# Altium footprint library ic.PcbLib: 108 footprints (part 6 of 7)
Each footprint in its own frame and in the unit in brackets; x right, y up, seen from the top. Pads: shape width x height; smd on the part's side, far side on the other; paste and mask are expansions set on the pad; w line width, h text height; cw(c..) or ccw(c..) is an arc to the next point about the centre after c.
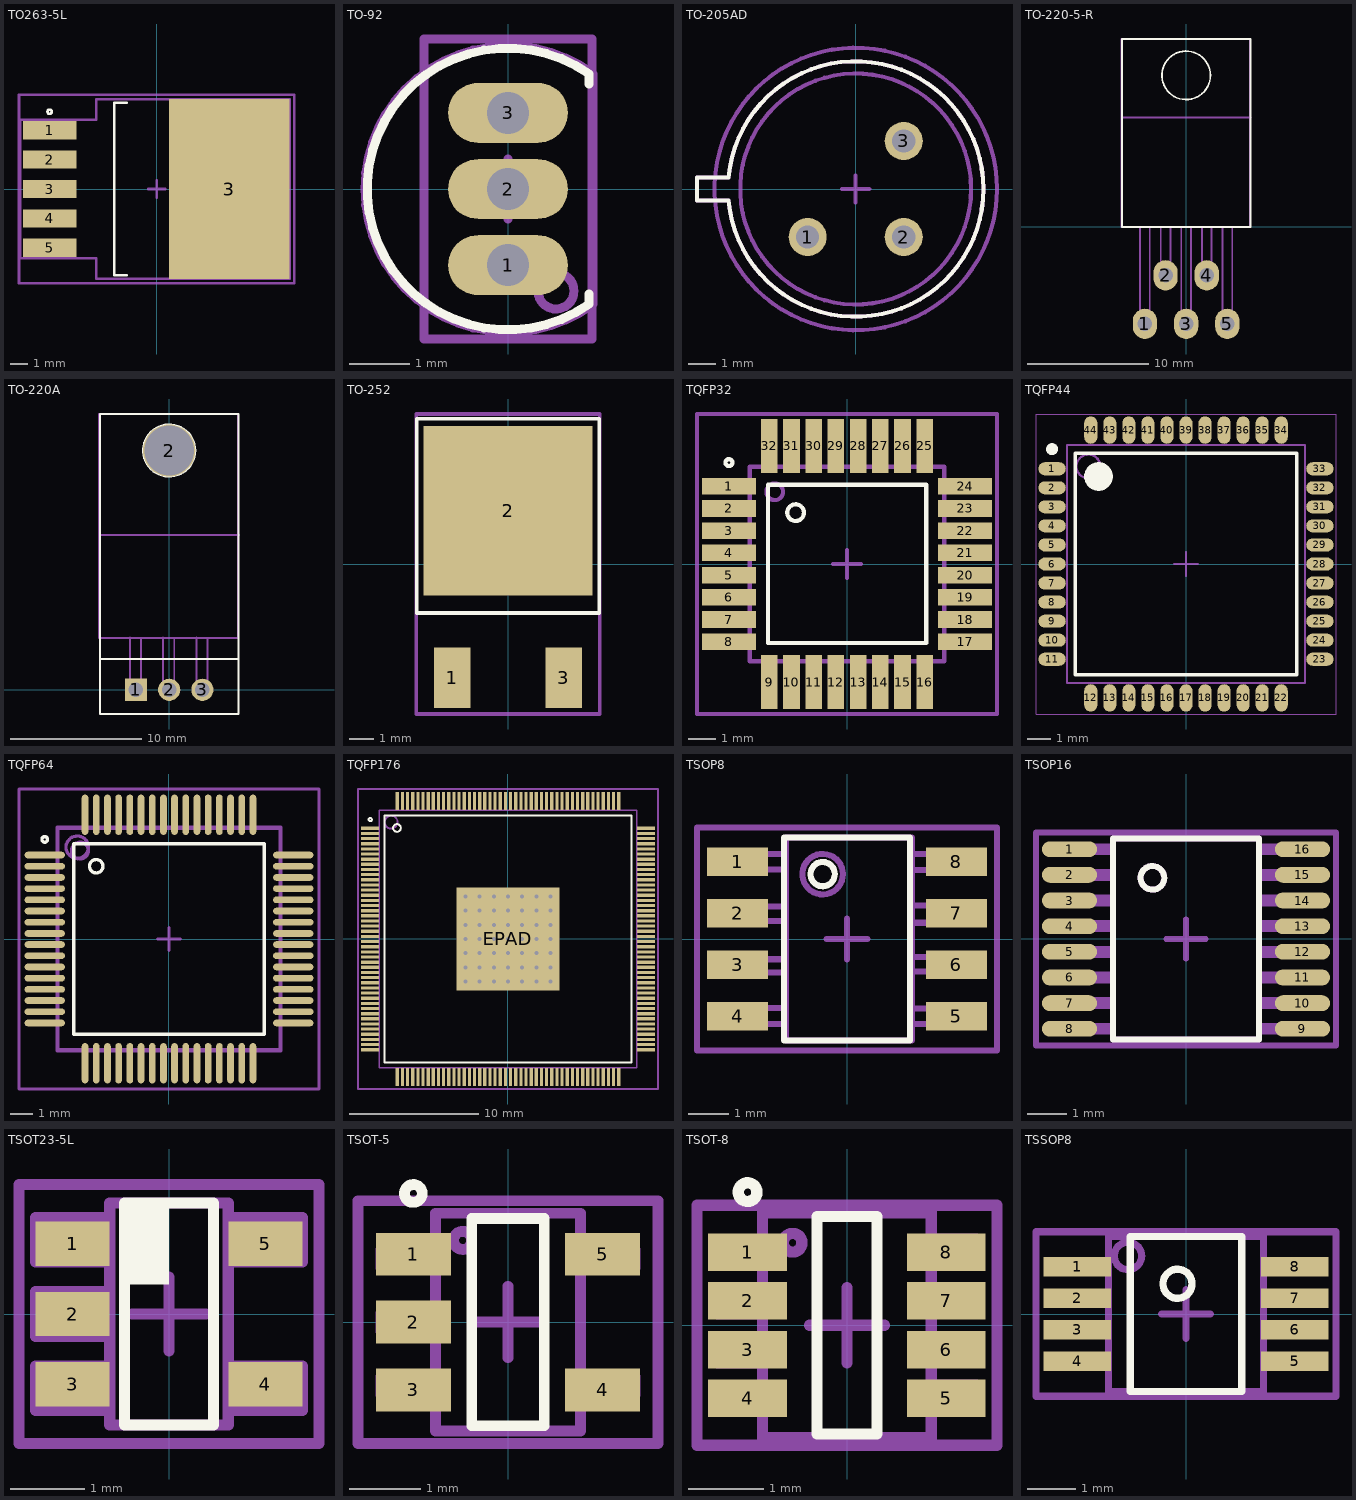
[diagram p5: the footprints below, top view; thin cyan lines are the x and y axes]

## TO263-5L [mm] "D2-PAK, 6-Pads, Body 7,35x8,36mm (max), IPC Medium Density"
height 4.6
pads (6):
  rect 3.1x1.05 smd: 1(-6.2,3.4) 2(-6.2,1.7) 3(-6.2,0) 4(-6.2,-1.7) 5(-6.2,-3.4)
  rect 7x10.4 smd: 3(4.2,0)
Top Overlay:
  circle w0.15: c-6.2,4.475 r0.125
  lines w0.15: -1.75,-5 -2.45,-5 -2.45,5 -1.75,5
Top Courtyard:
  lines w0.15: -0.5,0 0.5,0 ; 0,-0.5 0,0.5 ; -7.975,-5.45 7.975,-5.45 7.975,5.45 -7.975,5.45 -7.975,-5.45 ; -7.9,-4 -3.5,-4 -3.5,-5.2 7.7,-5.2 7.7,0 7.7,5.2 -3.5,5.2 -3.5,4 -7.9,4 -7.9,0 -7.9,-4
3D body "TO263-5L.step": height 4.6, standoff 0, extent -6.665,-5.05 7.685,5.05

## TO-92 [mm] "TO, Flat Index; 3 In-Line, Axial Leads; Body Dia. 4.6mm; Leads 0.41 x 0.39 mm (max)"
height 4.7
pads (3):
  oval 2x1 hole 0.7: 1(0,-1.27) 2(0,0) 3(0,1.27)
Top Overlay:
  lines w0.15: 1.35,-1.75 1.35,-1.92 cw(c0,0) 1.35,1.92 1.35,1.75
  text "." at 1.6,-1.3 h0.1
Top Courtyard:
  lines w0.15: -0.5,0 0.5,0 ; 0,-0.5 0,0.5 ; -1.4,-2.5 -1.4,0 -1.4,2.5 0,2.5 1.4,2.5 1.4,0 1.4,-2.5 0,-2.5 -1.4,-2.5
Mechanical 29:
  circle w0.15: c0.8,-1.7 r0.3
  lines w0.15: 1.415,-1.92 cw(c0,0) 1.415,1.92 1.415,-1.92
  text ".Designator" at -2.2,-0.3 h1
3D body "TO-92.STEP": height 7, standoff -3, extent -2.5,-2.499 1.501,2.499

## TO-205AD [mm]
height 10.1
pads (3):
  round 1.4 hole 0.85: 1(-1.768,-1.768) 2(1.768,-1.768) 3(1.768,1.768)
Top Overlay:
  lines w0.15: -5.84,-0.43 -5.84,0.43 -4.68,0.43 cw(c0,0) -4.68,-0.431 -5.84,-0.43
Top Courtyard:
  lines w0.15: -0.5,0 0.5,0 ; 0,-0.5 0,0.5
M15:
  circle w0.15: c0,0 r5.2
Mechanical 29:
  circle w0.15: c0,0 r4.25
  lines w0.15: -5.84,-0.43 -5.84,0.43 -4.68,0.43 cw(c0,0) -4.68,-0.431 -5.84,-0.43
  text ".Designator" at -3.3,-0.3 h1
3D body "TO-39.STEP": height 10.1, standoff -8.32, extent -6.645,-6.645 6.647,6.647

## TO-220-5-R [mm]
height 5
pads (5):
  oval 2x2.5 hole 1.2: 1(-3.4,-8) 2(-1.7,-4) 3(0,-8) 4(1.7,-4) 5(3.4,-8)
Top Overlay:
  circle w0.15: c0,12.5 r2
  lines w0.15: -5.3,0 5.3,0 5.3,15.5 -5.3,15.5 -5.3,0
Mechanical 29:
  lines w0.15: -5.35,9.025 5.325,9.025 ; -3.8,0 -3.8,-8 -3,-8 -3,0 ; -2.1,0 -2.1,-4 -1.3,-4 -1.3,0 ; -0.4,0 -0.4,-8 0.4,-8 0.4,0 ; 1.3,0 1.3,-4 2.1,-4 2.1,0 ; 3,0 3,-8 3.8,-8 3.8,0 ; -5.35,0 -5.35,15.5 5.275,15.5 5.275,0 -5.35,0
  text ".Designator" at -3.3,2.4 h1

## TO-220A [mm] "TO, Thru-Hole, Vertical, Heatsink Mounted; 3 In-Line Leads; Pitch 2.54 mm"
height 19.7
pads (4):
  rect 1.7x1.7 hole 1.1: 1(-2.54,0)
  round 4 hole 3.8: 2(0,18.288)
  round 1.7 hole 1.1: 2(0,0) 3(2.54,0)
Top Overlay:
  circle w0.15: c0,18.288 r2
  lines w0.15: -5.3,2.35 5.3,2.35 ; -5.3,-1.85 -5.3,21.082 5.3,21.082 5.3,-1.85 -5.3,-1.85
Mechanical 29:
  lines w0.15: -5.35,11.825 5.325,11.825 ; -3,4 -3,-0.4 -2.15,-0.4 -2.15,3.95 -2.9,3.95 ; -0.46,4 -0.46,-0.4 0.39,-0.4 0.39,3.95 -0.36,3.95 ; 2.08,4 2.08,-0.4 2.93,-0.4 2.93,3.95 2.18,3.95 ; -5.35,3.95 5.275,3.95 5.275,21.075 -5.35,21.075 -5.35,3.95
  text ".Designator" at -2.7,6 h1
3D body "TO220.STEP": height 4.5, standoff -3.5, extent -5.2,-0.254 5.2,20.846

## TO-252 [mm]
pads (3):
  rect 1.5x2.5 smd: 1(-2.3,-4.7) 3(2.3,-4.7)
  rect 7x7 smd: 2(0,2.2)
Top Overlay:
  lines w0.15: -3.775,-2.025 -3.775,6 3.775,6 3.775,-2.025 0,-2.025 -3.775,-2.025
  text "." at -3.6,-5 h0.1
Top Courtyard:
  lines w0.15: -0.5,0 0.5,0 ; 0,-0.5 0,0.5 ; -3.8,-6.2 -3.8,6.2 3.8,6.2 3.8,-6.2 -3.8,-6.2
3D body "D-PAK.STEP": height 2.3, standoff 0, extent -3.222,-4.925 3.272,4.575

## TQFP32 [mm] "Thin QFP, 32-Leads, Body 7x7mm, Pitch 0.8mm, IPC Low Density"
height 1.2
pads (32):
  rect 1.95x0.6 smd: 1(-4.25,2.8) 2(-4.25,2) 3(-4.25,1.2) 4(-4.25,0.4) 5(-4.25,-0.4) 6(-4.25,-1.2) 7(-4.25,-2) 8(-4.25,-2.8) 17(4.25,-2.8) 18(4.25,-2) 19(4.25,-1.2) 20(4.25,-0.4) 21(4.25,0.4) 22(4.25,1.2) 23(4.25,2) 24(4.25,2.8)
  rect 0.6x1.95 smd: 9(-2.8,-4.25) 10(-2,-4.25) 11(-1.2,-4.25) 12(-0.4,-4.25) 13(0.4,-4.25) 14(1.2,-4.25) 15(2,-4.25) 16(2.8,-4.25) 25(2.8,4.25) 26(2,4.25) 27(1.2,4.25) 28(0.4,4.25) 29(-0.4,4.25) 30(-1.2,4.25) 31(-2,4.25) 32(-2.8,4.25)
Top Overlay:
  circle w0.15: c-4.25,3.65 r0.125
  circle w0.15: c-1.85,1.85 r0.3
  lines w0.15: -2.85,-2.85 -2.85,2.85 2.85,2.85 2.85,-2.85 -2.85,-2.85
Top Courtyard:
  lines w0.15: -0.5,0 0.5,0 ; 0,-0.5 0,0.5 ; -5.4,-5.4 -5.4,5.4 5.4,5.4 5.4,-5.4 -5.4,-5.4
Mechanical 29:
  circle w0.15: c-2.6,2.6 r0.3
  lines w0.15: -3.5,-3 -5.15,-3 -5.15,-2.65 -3.5,-2.65 ; -3.5,-2.175 -5.15,-2.175 -5.15,-1.825 -3.5,-1.825 ; -3.5,-1.375 -5.15,-1.375 -5.15,-1.025 -3.5,-1.025 ; -3.5,-0.575 -5.15,-0.575 -5.15,-0.225 -3.5,-0.225 ; -3.5,0.225 -5.15,0.225 -5.15,0.575 -3.5,0.575 ; -3.5,1.05 -5.15,1.05 -5.15,1.4 -3.5,1.4 ; -3.5,1.85 -5.15,1.85 -5.15,2.2 -3.5,2.2 ; -3.5,2.65 -5.15,2.65 -5.15,3 -3.5,3 ; -3,-3.5 -3,-5.15 -2.65,-5.15 -2.65,-3.5 ; -3,3.5 -3,5.15 -2.65,5.15 -2.65,3.5 ; -2.2,-3.5 -2.2,-5.15 -1.85,-5.15 -1.85,-3.5 ; -2.175,3.5 -2.175,5.15 -1.825,5.15 -1.825,3.5 ; -1.4,-3.5 -1.4,-5.15 -1.05,-5.15 -1.05,-3.5 ; -1.375,3.5 -1.375,5.15 -1.025,5.15 -1.025,3.5 ; -0.575,-3.5 -0.575,-5.15 -0.225,-5.15 -0.225,-3.5 ; -0.575,3.5 -0.575,5.15 -0.225,5.15 -0.225,3.5 ; 0.225,-3.5 0.225,-5.15 0.575,-5.15 0.575,-3.5 ; 0.225,3.5 0.225,5.15 0.575,5.15 0.575,3.5 ; 1.025,-3.5 1.025,-5.15 1.375,-5.15 1.375,-3.5 ; 1.05,3.5 1.05,5.15 1.4,5.15 1.4,3.5 ; 1.825,-3.5 1.825,-5.15 2.175,-5.15 2.175,-3.5 ; 1.85,3.5 1.85,5.15 2.2,5.15 2.2,3.5 ; 2.65,-3.5 2.65,-5.15 3,-5.15 3,-3.5 ; 2.65,3.5 2.65,5.15 3,5.15 3,3.5 ; 3.5,-3 5.15,-3 5.15,-2.65 3.5,-2.65 ; 3.5,-2.2 5.15,-2.2 5.15,-1.85 3.5,-1.85 ; 3.5,-1.4 5.15,-1.4 5.15,-1.05 3.5,-1.05 ; 3.5,-0.575 5.15,-0.575 5.15,-0.225 3.5,-0.225 ; 3.5,0.225 5.15,0.225 5.15,0.575 3.5,0.575 ; 3.5,1.025 5.15,1.025 5.15,1.375 3.5,1.375 ; 3.5,1.825 5.15,1.825 5.15,2.175 3.5,2.175 ; 3.5,2.65 5.15,2.65 5.15,3 3.5,3 ; -3.5,-3.5 -3.5,3.5 3.5,3.5 3.5,-3.5 -3.5,-3.5
  text ".Designator" at -2.8,-0.3 h1

## TQFP44 [mm] "TQFP, 44-Leads, Body 10,00x10,00mm, Pitch 0,80mm, IPC High Density"
height 1.2
pads (44):
  oval 1.15x0.55 smd: 1(-5.625,4) 2(-5.625,3.2) 3(-5.625,2.4) 4(-5.625,1.6) 5(-5.625,0.8) 6(-5.625,0) 7(-5.625,-0.8) 8(-5.625,-1.6) 9(-5.625,-2.4) 10(-5.625,-3.2) 11(-5.625,-4) 23(5.625,-4) 24(5.625,-3.2) 25(5.625,-2.4) 26(5.625,-1.6) 27(5.625,-0.8) 28(5.625,0) 29(5.625,0.8) 30(5.625,1.6) 31(5.625,2.4) 32(5.625,3.2) 33(5.625,4)
  oval 0.55x1.15 smd: 12(-4,-5.625) 13(-3.2,-5.625) 14(-2.4,-5.625) 15(-1.6,-5.625) 16(-0.8,-5.625) 17(0,-5.625) 18(0.8,-5.625) 19(1.6,-5.625) 20(2.4,-5.625) 21(3.2,-5.625) 22(4,-5.625) 34(4,5.625) 35(3.2,5.625) 36(2.4,5.625) 37(1.6,5.625) 38(0.8,5.625) 39(0,5.625) 40(-0.8,5.625) 41(-1.6,5.625) 42(-2.4,5.625) 43(-3.2,5.625) 44(-4,5.625)
Top Overlay:
  circle w0.25: c-5.625,4.825 r0.125
  circle w0.6: c-3.675,3.675 r0.3
  lines w0.15: -4.65,-4.65 -4.65,4.65 4.65,4.65 4.65,-4.65 -4.65,-4.65
Top Courtyard:
  lines w0.05: -6.3,-6.3 -6.3,6.3 6.3,6.3 6.3,-6.3 -6.3,-6.3
  lines w0.1: -0.5,0 0.5,0 ; 0,-0.5 0,0.5
Mechanical 13:
  circle w0.1: c-4.1,4.1 r0.5
  lines w0.1: -5,-5 -5,5 5,5 5,-5 -5,-5
3D body "TQFP44.step": height 1.2, standoff 0, extent -6,-6 6,6

## TQFP64 [mm]
pads (64):
  oval 1.8x0.3 smd: 1(-5.55,3.75) 2(-5.55,3.25) 3(-5.55,2.75) 4(-5.55,2.25) 5(-5.55,1.75) 6(-5.55,1.25) 7(-5.55,0.75) 8(-5.55,0.25) 9(-5.55,-0.25) 10(-5.55,-0.75) 11(-5.55,-1.25) 12(-5.55,-1.75) 13(-5.55,-2.25) 14(-5.55,-2.75) 15(-5.55,-3.25) 16(-5.55,-3.75) 33(5.55,-3.75) 34(5.55,-3.25) 35(5.55,-2.75) 36(5.55,-2.25) 37(5.55,-1.75) 38(5.55,-1.25) 39(5.55,-0.75) 40(5.55,-0.25) 41(5.55,0.25) 42(5.55,0.75) 43(5.55,1.25) 44(5.55,1.75) 45(5.55,2.25) 46(5.55,2.75) 47(5.55,3.25) 48(5.55,3.75)
  oval 0.3x1.8 smd: 17(-3.75,-5.55) 18(-3.25,-5.55) 19(-2.75,-5.55) 20(-2.25,-5.55) 21(-1.75,-5.55) 22(-1.25,-5.55) 23(-0.75,-5.55) 24(-0.25,-5.55) 25(0.25,-5.55) 26(0.75,-5.55) 27(1.25,-5.55) 28(1.75,-5.55) 29(2.25,-5.55) 30(2.75,-5.55) 31(3.25,-5.55) 32(3.75,-5.55) 49(3.75,5.55) 50(3.25,5.55) 51(2.75,5.55) 52(2.25,5.55) 53(1.75,5.55) 54(1.25,5.55) 55(0.75,5.55) 56(0.25,5.55) 57(-0.25,5.55) 58(-0.75,5.55) 59(-1.25,5.55) 60(-1.75,5.55) 61(-2.25,5.55) 62(-2.75,5.55) 63(-3.25,5.55) 64(-3.75,5.55)
Top Overlay:
  circle w0.15: c-3.25,3.25 r0.3
  circle w0.15: c-5.55,4.45 r0.125
  lines w0.15: -4.25,-4.25 4.25,-4.25 4.25,4.25 -4.25,4.25 -4.25,-4.25
Top Courtyard:
  lines w0.15: -0.5,0 0.5,0 ; 0,-0.5 0,0.5 ; -6.7,-6.7 6.7,-6.7 6.7,6.7 -6.7,6.7 -6.7,-6.7
Mechanical 13:
  circle w0.15: c-4.1,4.1 r0.5
Mechanical 29:
  circle w0.15: c-3.975,3.95 r0.375
  lines w0.15: -6.35,-3.8 -4.975,-3.8 ; -6.35,-3.275 -4.975,-3.275 ; -6.35,-2.775 -4.975,-2.775 ; -6.35,-2.275 -4.975,-2.275 ; -6.35,-1.8 -4.975,-1.8 ; -6.35,-1.275 -4.975,-1.275 ; -6.35,-0.775 -4.975,-0.775 ; -6.35,-0.275 -4.975,-0.275 ; -6.35,0.2 -4.975,0.2 ; -6.35,0.725 -4.975,0.725 ; -6.35,1.225 -4.975,1.225 ; -6.35,1.725 -4.975,1.725 ; -6.35,2.2 -4.975,2.2 ; -6.35,2.725 -4.975,2.725 ; -6.35,3.225 -4.975,3.225 ; -6.35,3.725 -4.975,3.725 -4.975,3.9 ; -3.925,-4.95 -3.75,-4.95 -3.75,-6.325 ; -3.925,4.95 -3.75,4.95 -3.75,6.325 ; -3.25,-6.325 -3.25,-4.95 ; -3.25,4.95 -3.25,6.325 ; -2.75,-6.325 -2.75,-4.95 ; -2.75,4.95 -2.75,6.325 ; -2.225,-6.325 -2.225,-4.95 ; -2.225,4.95 -2.225,6.325 ; -1.75,-6.325 -1.75,-4.95 ; -1.75,4.95 -1.75,6.325 ; -1.25,-6.325 -1.25,-4.95 ; -1.25,4.95 -1.25,6.325 ; -0.75,-6.325 -0.75,-4.95 ; -0.75,4.95 -0.75,6.325 ; -0.225,-6.325 -0.225,-4.95 ; -0.225,4.95 -0.225,6.325 ; 0.25,-6.325 0.25,-4.95 ; 0.25,4.95 0.25,6.325 ; 0.75,-6.325 0.75,-4.95 ; 0.75,4.95 0.75,6.325 ; 1.25,-6.325 1.25,-4.95 ; 1.25,4.95 1.25,6.325 ; 1.775,-6.325 1.775,-4.95 ; 1.775,4.95 1.775,6.325 ; 2.25,-6.325 2.25,-4.95 ; 2.25,4.95 2.25,6.325 ; 2.75,-6.325 2.75,-4.95 ; 2.75,4.95 2.75,6.325 ; 3.25,-6.325 3.25,-4.95 ; 3.25,4.95 3.25,6.325 ; 3.775,-6.325 3.775,-4.95 ; 3.775,4.95 3.775,6.325 ; 4.975,-3.8 6.35,-3.8 ; 4.975,-3.275 6.35,-3.275 ; 4.975,-2.775 6.35,-2.775 ; 4.975,-2.275 6.35,-2.275 ; 4.975,-1.8 6.35,-1.8 ; 4.975,-1.275 6.35,-1.275 ; 4.975,-0.775 6.35,-0.775 ; 4.975,-0.275 6.35,-0.275 ; 4.975,0.2 6.35,0.2 ; 4.975,0.725 6.35,0.725 ; 4.975,1.225 6.35,1.225 ; 4.975,1.725 6.35,1.725 ; 4.975,2.2 6.35,2.2 ; 4.975,2.725 6.35,2.725 ; 4.975,3.225 6.35,3.225 ; 4.975,3.9 4.975,3.725 6.35,3.725 ; -5,-5 5,-5 5,5 -5,5 -5,-5 ; -4.975,-4.95 4.975,-4.95 4.975,4.95 -4.975,4.95 -4.975,-4.95
  text ".Designator" at -3.4,-0.3 h1
3D body "tqfp64.stp": height 1.1, standoff 0, extent -6,-6 6,6

## TQFP176 [mm] "TQFP, 176-Leads, Body 20,00x20,00mm, Pitch 0,40mm, Thermal Pad 8,00x8,00mm, IPC Medium Density"
height 1.2
pads (177):
  rect 1.4x0.25 smd: 1(-10.7,8.6) 2(-10.7,8.2) 3(-10.7,7.8) 4(-10.7,7.4) 5(-10.7,7) 6(-10.7,6.6) 7(-10.7,6.2) 8(-10.7,5.8) 9(-10.7,5.4) 10(-10.7,5) 11(-10.7,4.6) 12(-10.7,4.2) 13(-10.7,3.8) 14(-10.7,3.4) 15(-10.7,3) 16(-10.7,2.6) 17(-10.7,2.2) 18(-10.7,1.8) 19(-10.7,1.4) 20(-10.7,1) 21(-10.7,0.6) 22(-10.7,0.2) 23(-10.7,-0.2) 24(-10.7,-0.6) 25(-10.7,-1) 26(-10.7,-1.4) 27(-10.7,-1.8) 28(-10.7,-2.2) 29(-10.7,-2.6) 30(-10.7,-3) 31(-10.7,-3.4) 32(-10.7,-3.8) 33(-10.7,-4.2) 34(-10.7,-4.6) 35(-10.7,-5) 36(-10.7,-5.4) 37(-10.7,-5.8) 38(-10.7,-6.2) 39(-10.7,-6.6) 40(-10.7,-7) 41(-10.7,-7.4) 42(-10.7,-7.8) 43(-10.7,-8.2) 44(-10.7,-8.6) 89(10.7,-8.6) 90(10.7,-8.2) 91(10.7,-7.8) 92(10.7,-7.4) 93(10.7,-7) 94(10.7,-6.6) 95(10.7,-6.2) 96(10.7,-5.8) 97(10.7,-5.4) 98(10.7,-5) 99(10.7,-4.6) 100(10.7,-4.2) 101(10.7,-3.8) 102(10.7,-3.4) 103(10.7,-3) 104(10.7,-2.6) 105(10.7,-2.2) 106(10.7,-1.8) 107(10.7,-1.4) 108(10.7,-1) 109(10.7,-0.6) 110(10.7,-0.2) 111(10.7,0.2) 112(10.7,0.6) 113(10.7,1) 114(10.7,1.4) 115(10.7,1.8) 116(10.7,2.2) 117(10.7,2.6) 118(10.7,3) 119(10.7,3.4) 120(10.7,3.8) 121(10.7,4.2) 122(10.7,4.6) 123(10.7,5) 124(10.7,5.4) 125(10.7,5.8) 126(10.7,6.2) 127(10.7,6.6) 128(10.7,7) 129(10.7,7.4) 130(10.7,7.8) 131(10.7,8.2) 132(10.7,8.6)
  rect 0.25x1.4 smd: 45(-8.6,-10.7) 46(-8.2,-10.7) 47(-7.8,-10.7) 48(-7.4,-10.7) 49(-7,-10.7) 50(-6.6,-10.7) 51(-6.2,-10.7) 52(-5.8,-10.7) 53(-5.4,-10.7) 54(-5,-10.7) 55(-4.6,-10.7) 56(-4.2,-10.7) 57(-3.8,-10.7) 58(-3.4,-10.7) 59(-3,-10.7) 60(-2.6,-10.7) 61(-2.2,-10.7) 62(-1.8,-10.7) 63(-1.4,-10.7) 64(-1,-10.7) 65(-0.6,-10.7) 66(-0.2,-10.7) 67(0.2,-10.7) 68(0.6,-10.7) 69(1,-10.7) 70(1.4,-10.7) 71(1.8,-10.7) 72(2.2,-10.7) 73(2.6,-10.7) 74(3,-10.7) 75(3.4,-10.7) 76(3.8,-10.7) 77(4.2,-10.7) 78(4.6,-10.7) 79(5,-10.7) 80(5.4,-10.7) 81(5.8,-10.7) 82(6.2,-10.7) 83(6.6,-10.7) 84(7,-10.7) 85(7.4,-10.7) 86(7.8,-10.7) 87(8.2,-10.7) 88(8.6,-10.7) 133(8.6,10.7) 134(8.2,10.7) 135(7.8,10.7) 136(7.4,10.7) 137(7,10.7) 138(6.6,10.7) 139(6.2,10.7) 140(5.8,10.7) 141(5.4,10.7) 142(5,10.7) 143(4.6,10.7) 144(4.2,10.7) 145(3.8,10.7) 146(3.4,10.7) 147(3,10.7) 148(2.6,10.7) 149(2.2,10.7) 150(1.8,10.7) 151(1.4,10.7) 152(1,10.7) 153(0.6,10.7) 154(0.2,10.7) 155(-0.2,10.7) 156(-0.6,10.7) 157(-1,10.7) 158(-1.4,10.7) 159(-1.8,10.7) 160(-2.2,10.7) 161(-2.6,10.7) 162(-3,10.7) 163(-3.4,10.7) 164(-3.8,10.7) 165(-4.2,10.7) 166(-4.6,10.7) 167(-5,10.7) 168(-5.4,10.7) 169(-5.8,10.7) 170(-6.2,10.7) 171(-6.6,10.7) 172(-7,10.7) 173(-7.4,10.7) 174(-7.8,10.7) 175(-8.2,10.7) 176(-8.6,10.7)
  rect 8x8 smd: EPAD(0,0)
via 3.3,-3.3 diameter 0.7 hole 0.3
via 2.2,-3.3 diameter 0.7 hole 0.3
via 1.1,-3.3 diameter 0.7 hole 0.3
via 0,-3.3 diameter 0.7 hole 0.3
via -1.1,-3.3 diameter 0.7 hole 0.3
via -2.2,-3.3 diameter 0.7 hole 0.3
via -3.3,-3.3 diameter 0.7 hole 0.3
via 3.3,-2.2 diameter 0.7 hole 0.3
via 2.2,-2.2 diameter 0.7 hole 0.3
via 1.1,-2.2 diameter 0.7 hole 0.3
via 0,-2.2 diameter 0.7 hole 0.3
via -1.1,-2.2 diameter 0.7 hole 0.3
via -2.2,-2.2 diameter 0.7 hole 0.3
via -3.3,-2.2 diameter 0.7 hole 0.3
via 3.3,-1.1 diameter 0.7 hole 0.3
via 2.2,-1.1 diameter 0.7 hole 0.3
via 1.1,-1.1 diameter 0.7 hole 0.3
via 0,-1.1 diameter 0.7 hole 0.3
via -1.1,-1.1 diameter 0.7 hole 0.3
via -2.2,-1.1 diameter 0.7 hole 0.3
via -3.3,-1.1 diameter 0.7 hole 0.3
via 3.3,0 diameter 0.7 hole 0.3
via 2.2,0 diameter 0.7 hole 0.3
via 1.1,0 diameter 0.7 hole 0.3
via 0,0 diameter 0.7 hole 0.3
via -1.1,0 diameter 0.7 hole 0.3
via -2.2,0 diameter 0.7 hole 0.3
via -3.3,0 diameter 0.7 hole 0.3
via 3.3,1.1 diameter 0.7 hole 0.3
via 2.2,1.1 diameter 0.7 hole 0.3
via 1.1,1.1 diameter 0.7 hole 0.3
via 0,1.1 diameter 0.7 hole 0.3
via -1.1,1.1 diameter 0.7 hole 0.3
via -2.2,1.1 diameter 0.7 hole 0.3
via -3.3,1.1 diameter 0.7 hole 0.3
via 3.3,2.2 diameter 0.7 hole 0.3
via 2.2,2.2 diameter 0.7 hole 0.3
via 1.1,2.2 diameter 0.7 hole 0.3
via 0,2.2 diameter 0.7 hole 0.3
via -1.1,2.2 diameter 0.7 hole 0.3
via -2.2,2.2 diameter 0.7 hole 0.3
via -3.3,2.2 diameter 0.7 hole 0.3
via 3.3,3.3 diameter 0.7 hole 0.3
via 2.2,3.3 diameter 0.7 hole 0.3
via 1.1,3.3 diameter 0.7 hole 0.3
via 0,3.3 diameter 0.7 hole 0.3
via -1.1,3.3 diameter 0.7 hole 0.3
via -2.2,3.3 diameter 0.7 hole 0.3
via -3.3,3.3 diameter 0.7 hole 0.3
Top Overlay:
  circle w0.15: c-8.625,8.625 r0.3
  circle w0.15: c-10.7,9.275 r0.125
  lines w0.15: -9.6,-9.6 9.6,-9.6 9.6,9.6 -9.6,9.6 -9.6,-9.6
Top Courtyard:
  lines w0.15: -0.5,0 0.5,0 ; 0,-0.5 0,0.5 ; -11.65,-11.65 11.65,-11.65 11.65,11.65 -11.65,11.65 -11.65,-11.65
Mechanical 29:
  circle w0.15: c-9.075,9.075 r0.5
  lines w0.15: -10,-10 10,-10 10,10 -10,10 -10,-10
  text ".Designator" at -3.9,-0.9 h1

## TSOP8 [mm] "8-Lead Plastic Small Outline, Body 4,90x3,85mm, Pitch 1,27mm, IPC Medium Density"
height 1.36
pads (8):
  rect 1.5x0.7 smd: 1(-2.7,1.905) 2(-2.7,0.635) 3(-2.7,-0.635) 4(-2.7,-1.905) 5(2.7,-1.905) 6(2.7,-0.635) 7(2.7,0.635) 8(2.7,1.905)
Top Overlay:
  circle w0.15: c-0.6,1.6 r0.3
  lines w0.15: -1.55,-2.5 1.55,-2.5 1.55,2.5 -1.55,2.5 -1.55,-2.5
  text "." at -2.7,2.8 h0.1
Top Courtyard:
  lines w0.15: -0.5,0 0.5,0 ; 0,-0.5 0,0.5 ; -3.7,-2.75 3.7,-2.75 3.7,2.75 -3.7,2.75 -3.7,-2.75
Mechanical 29:
  circle w0.15: c-0.6,1.6 r0.5
  lines w0.15: -3.3,-2.1 -3.3,-1.7 -1.5,-1.7 -1.5,-2.1 -3.3,-2.1 ; -3.3,-0.83 -3.3,-0.5 -1.5,-0.5 -1.5,-0.83 -3.3,-0.83 ; -3.3,0.44 -3.3,0.8 -1.5,0.8 -1.5,0.44 -3.3,0.44 ; -3.3,1.71 -1.5,1.71 -1.5,2.1 -3.3,2.1 -3.3,1.71 ; -1.5,-2.5 -1.5,2.5 1.6,2.5 1.6,-2.5 -1.5,-2.5 ; 1.6,-2.1 3.3,-2.1 3.3,-1.71 1.6,-1.71 1.6,-2.1 ; 1.6,-0.8 3.3,-0.8 3.3,-0.44 1.6,-0.44 1.6,-0.8 ; 1.6,0.4 3.3,0.4 3.3,0.83 1.6,0.83 1.6,0.4 ; 1.6,1.7 3.3,1.7 3.3,2.1 1.6,2.1 1.6,1.7
  text ".Designator" at -1.3,-0.4 h1

## TSOP16 [mm] "TSOP, 16-Leads, Body 5,00x4,40mm, Pitch 0,65mm, IPC Medium Density"
height 1.2
pads (16):
  oval 1.4x0.4 smd: 1(-2.95,2.275) 2(-2.95,1.625) 3(-2.95,0.975) 4(-2.95,0.325) 5(-2.95,-0.325) 6(-2.95,-0.975) 7(-2.95,-1.625) 8(-2.95,-2.275) 9(2.95,-2.275) 10(2.95,-1.625) 11(2.95,-0.975) 12(2.95,-0.325) 13(2.95,0.325) 14(2.95,0.975) 15(2.95,1.625) 16(2.95,2.275)
Top Overlay:
  circle w0.15: c-0.85,1.55 r0.3
  lines w0.15: -1.85,-2.55 -1.85,2.55 1.85,2.55 1.85,-2.55 -1.85,-2.55
  text "." at -2.9,2.9 h0.1
Top Courtyard:
  lines w0.15: -0.5,0 0.5,0 ; 0,-0.5 0,0.5 ; -3.8,-2.7 -3.8,2.7 3.8,2.7 3.8,-2.7 -3.8,-2.7
Mechanical 29:
  circle w0.15: c-0.85,1.55 r0.3
  lines w0.15: -3.425,-2.35 -1.85,-2.35 -1.85,-2.2 -3.425,-2.2 -3.425,-2.35 ; -3.425,-1.7 -3.425,-1.55 -1.85,-1.55 -1.85,-1.7 -3.425,-1.7 ; -3.425,-1.05 -3.425,-0.9 -1.85,-0.9 -1.85,-1.05 -3.425,-1.05 ; -3.425,-0.4 -3.425,-0.25 -1.85,-0.25 -1.85,-0.4 -3.425,-0.4 ; -3.425,0.25 -3.425,0.4 -1.85,0.4 -1.85,0.25 -3.425,0.25 ; -3.425,0.9 -3.425,1.05 -1.85,1.05 -1.85,0.9 -3.425,0.9 ; -3.425,1.55 -3.425,1.7 -1.85,1.7 -1.85,1.55 -3.425,1.55 ; -3.425,2.2 -3.425,2.35 -1.85,2.35 -1.85,2.2 -3.425,2.2 ; -1.85,-2.55 1.85,-2.55 1.85,2.55 -1.85,2.55 -1.85,-2.55 ; 1.85,-2.35 1.85,-2.2 3.425,-2.2 3.425,-2.35 1.85,-2.35 ; 1.85,-1.7 1.85,-1.55 3.425,-1.55 3.425,-1.7 1.85,-1.7 ; 1.85,-1.05 1.85,-0.9 3.425,-0.9 3.425,-1.05 1.85,-1.05 ; 1.85,-0.4 1.85,-0.25 3.425,-0.25 3.425,-0.4 1.85,-0.4 ; 1.85,0.25 1.85,0.4 3.425,0.4 3.425,0.25 1.85,0.25 ; 1.85,0.9 1.85,1.05 3.425,1.05 3.425,0.9 1.85,0.9 ; 1.85,1.55 1.85,1.7 3.425,1.7 3.425,1.55 1.85,1.55 ; 1.85,2.2 1.85,2.35 3.425,2.35 3.425,2.2 1.85,2.2
  text ".Designator" at -1.7,-0.4 h1
3D body "User Library-User Library-TSSOP16.step": height 1.1, standoff 0, extent -3.19,-2.5 3.21,2.5

## TSOT23-5L [mm] "SOT23, 5-Leads, Body 2,95x2,65mm, Pitch 0,95mm, IPC Medium Density"
height 1.1
pads (5):
  rect 1x0.6 smd: 1(-1.3,0.95) 2(-1.3,0) 3(-1.3,-0.95) 4(1.3,-0.95) 5(1.3,0.95)
Top Overlay:
  rectangle: -0.6,0.4 0,1.5
  lines w0.15: -0.6,-1.5 0.6,-1.5 0.6,1.5 -0.6,1.5 -0.6,-1.5
  text "." at -1.3,1.7 h0.1
Top Courtyard:
  lines w0.15: -0.5,0 0.5,0 ; 0,-0.5 0,0.5 ; -2.025,-1.75 -2.025,1.75 2.025,1.75 2.025,-1.75 -2.025,-1.75
Mechanical 13:
  lines w0.15: -0.8,-1.5 -0.8,1.5 0.8,1.5 0.8,-1.5 -0.8,-1.5
Mechanical 29:
  lines w0.15: -0.8,-1.3 -1.8,-1.3 -1.8,-0.7 -0.8,-0.7 ; -0.8,-0.3 -1.8,-0.3 -1.8,0.3 -0.8,0.3 ; -0.8,0.7 -1.8,0.7 -1.8,1.3 -0.8,1.3 ; 0.8,-1.3 1.8,-1.3 1.8,-0.7 0.8,-0.7 ; 0.8,0.7 1.8,0.7 1.8,1.3 0.8,1.3 ; -0.8,-1.5 0.8,-1.5 0.8,1.5 -0.8,1.5 -0.8,-1.5
  text ".Designator" at -1.9,1.9 h1
3D body "TSOT23-5L  .step": height 1.1, standoff 0, extent -1.4,-1.5 1.4,1.5

## TSOT-5 [mm]
height 1
pads (5):
  rect 1.05x0.6 smd: 1(-1.325,0.95) 2(-1.325,0) 3(-1.325,-0.95) 4(1.325,-0.95) 5(1.325,0.95)
Top Overlay:
  circle w0.15: c-1.325,1.8 r0.125
  lines w0.15: -0.508,-1.45 0.508,-1.45 0.508,1.45 -0.508,1.45 -0.508,-1.45
Top Courtyard:
  lines w0.15: -0.5,0 0.5,0 ; 0,-0.5 0,0.5 ; -2.1,-1.7 2.1,-1.7 2.1,1.7 -2.1,1.7 -2.1,-1.7
Mechanical 29:
  circle w0.15: c-0.635,1.143 r0.127
  lines w0.15: -1.016,-1.016 -1.778,-1.016 -1.778,-0.762 -1.016,-0.762 ; -1.016,-0.127 -1.778,-0.127 -1.778,0.127 -1.016,0.127 ; -1.016,0 -1.016,0.254 ; 1.016,-1.016 1.778,-1.016 1.778,-0.762 1.016,-0.762 ; -1.778,0.762 -1.016,0.762 -1.016,1.016 -1.778,1.016 -1.778,0.762 ; -1.016,-1.524 1.016,-1.524 1.016,1.524 -1.016,1.524 -1.016,-1.524 ; 1.016,0.762 1.778,0.762 1.778,1.016 1.016,1.016 1.016,0.762
  text ".Designator" at -1.9,1.8 h1

## TSOT-8 [mm] "TSOT, 8-Leads, Body 2,90x1,60mm, Pitch 0,65mm, IPC Medium Density"
height 1
pads (8):
  rect 1.05x0.5 smd: 1(-1.325,0.975) 2(-1.325,0.325) 3(-1.325,-0.325) 4(-1.325,-0.975) 5(1.325,-0.975) 6(1.325,-0.325) 7(1.325,0.325) 8(1.325,0.975)
Top Overlay:
  circle w0.15: c-1.325,1.775 r0.125
  lines w0.15: -0.4,-1.45 -0.4,1.45 0.4,1.45 0.4,-1.45 -0.4,-1.45
Top Courtyard:
  lines w0.15: -0.5,0 0.5,0 ; 0,-0.5 0,0.5 ; -2,-1.6 -2,1.6 2,1.6 2,-1.6 -2,-1.6
Mechanical 29:
  circle w0.15: c-0.725,1.1 r0.125
  lines w0.15: -1.725,-1.15 -1.725,-0.85 -1.125,-0.85 -1.125,-1.15 -1.725,-1.15 ; -1.725,-0.5 -1.725,-0.2 -1.125,-0.2 -1.125,-0.5 -1.725,-0.5 ; -1.725,0.15 -1.725,0.45 -1.125,0.45 -1.125,0.15 -1.725,0.15 ; -1.725,0.8 -1.725,1.1 -1.125,1.1 -1.125,0.8 -1.725,0.8 ; -1.125,-1.5 1.125,-1.5 1.125,1.5 -1.125,1.5 -1.125,-1.5 ; 1.125,-1.1 1.125,-0.8 1.725,-0.8 1.725,-1.1 1.125,-1.1 ; 1.125,-0.45 1.125,-0.15 1.725,-0.15 1.725,-0.45 1.125,-0.45 ; 1.125,0.2 1.125,0.5 1.725,0.5 1.725,0.2 1.125,0.2 ; 1.125,0.85 1.725,0.85 1.725,1.15 1.125,1.15 1.125,0.85
  text ".Designator" at -1.9,1.8 h1

## TSSOP8 [mm]
height 1.1
pads (8):
  rect 1.4x0.4 smd: 1(-2.25,0.975) 2(-2.25,0.325) 3(-2.25,-0.325) 4(-2.25,-0.975) 5(2.25,-0.975) 6(2.25,-0.325) 7(2.25,0.325) 8(2.25,0.975)
Top Overlay:
  circle w0.15: c-0.175,0.625 r0.3
  lines w0.15: -1.15,-1.6 1.15,-1.6 1.15,1.6 -1.15,1.6 -1.15,-1.6
  text "." at -2.3,1.7 h0.1
Top Courtyard:
  lines w0.15: -0.5,0 0.5,0 ; 0,-0.5 0,0.5 ; -3.1,-1.7 -3.1,1.7 3.1,1.7 3.1,-1.7 -3.1,-1.7
Mechanical 29:
  circle w0.15: c-1.2,1.2 r0.283
  lines w0.15: -2.6,-1.1 -2.6,-0.9 -1.6,-0.9 -1.6,-1.1 -2.6,-1.1 ; -2.6,-0.4 -2.6,-0.2 -1.6,-0.2 -1.6,-0.4 -2.6,-0.4 ; -2.6,0.2 -2.6,0.4 -1.6,0.4 -1.6,0.2 -2.6,0.2 ; -2.6,0.9 -1.6,0.9 -1.6,1.1 -2.6,1.1 -2.6,0.9 ; -1.6,-1.6 -1.6,1.6 1.6,1.6 1.6,-1.6 -1.6,-1.6 ; 1.6,-1.1 2.6,-1.1 2.6,-0.9 1.6,-0.9 1.6,-1.1 ; 1.6,-0.4 2.6,-0.4 2.6,-0.2 1.6,-0.2 1.6,-0.4 ; 1.6,0.2 2.6,0.2 2.6,0.4 1.6,0.4 1.6,0.2 ; 1.6,0.9 2.6,0.9 2.6,1.1 1.6,1.1 1.6,0.9
  text ".Designator" at -1.3,-0.7 h2
3D body "tssop8.STEP": height 0.9, standoff 0, extent -2.528,-1.6 2.528,1.6